# Altium footprint library con-samtec.PCBLIB: 805 footprints (part 43 of 55)
Each footprint in its own frame and in the unit in brackets; x right, y up, seen from the top. Pads: shape width x height; smd on the part's side, far side on the other; paste and mask are expansions set on the pad; w line width, h text height; cw(c..) or ccw(c..) is an arc to the next point about the centre after c.
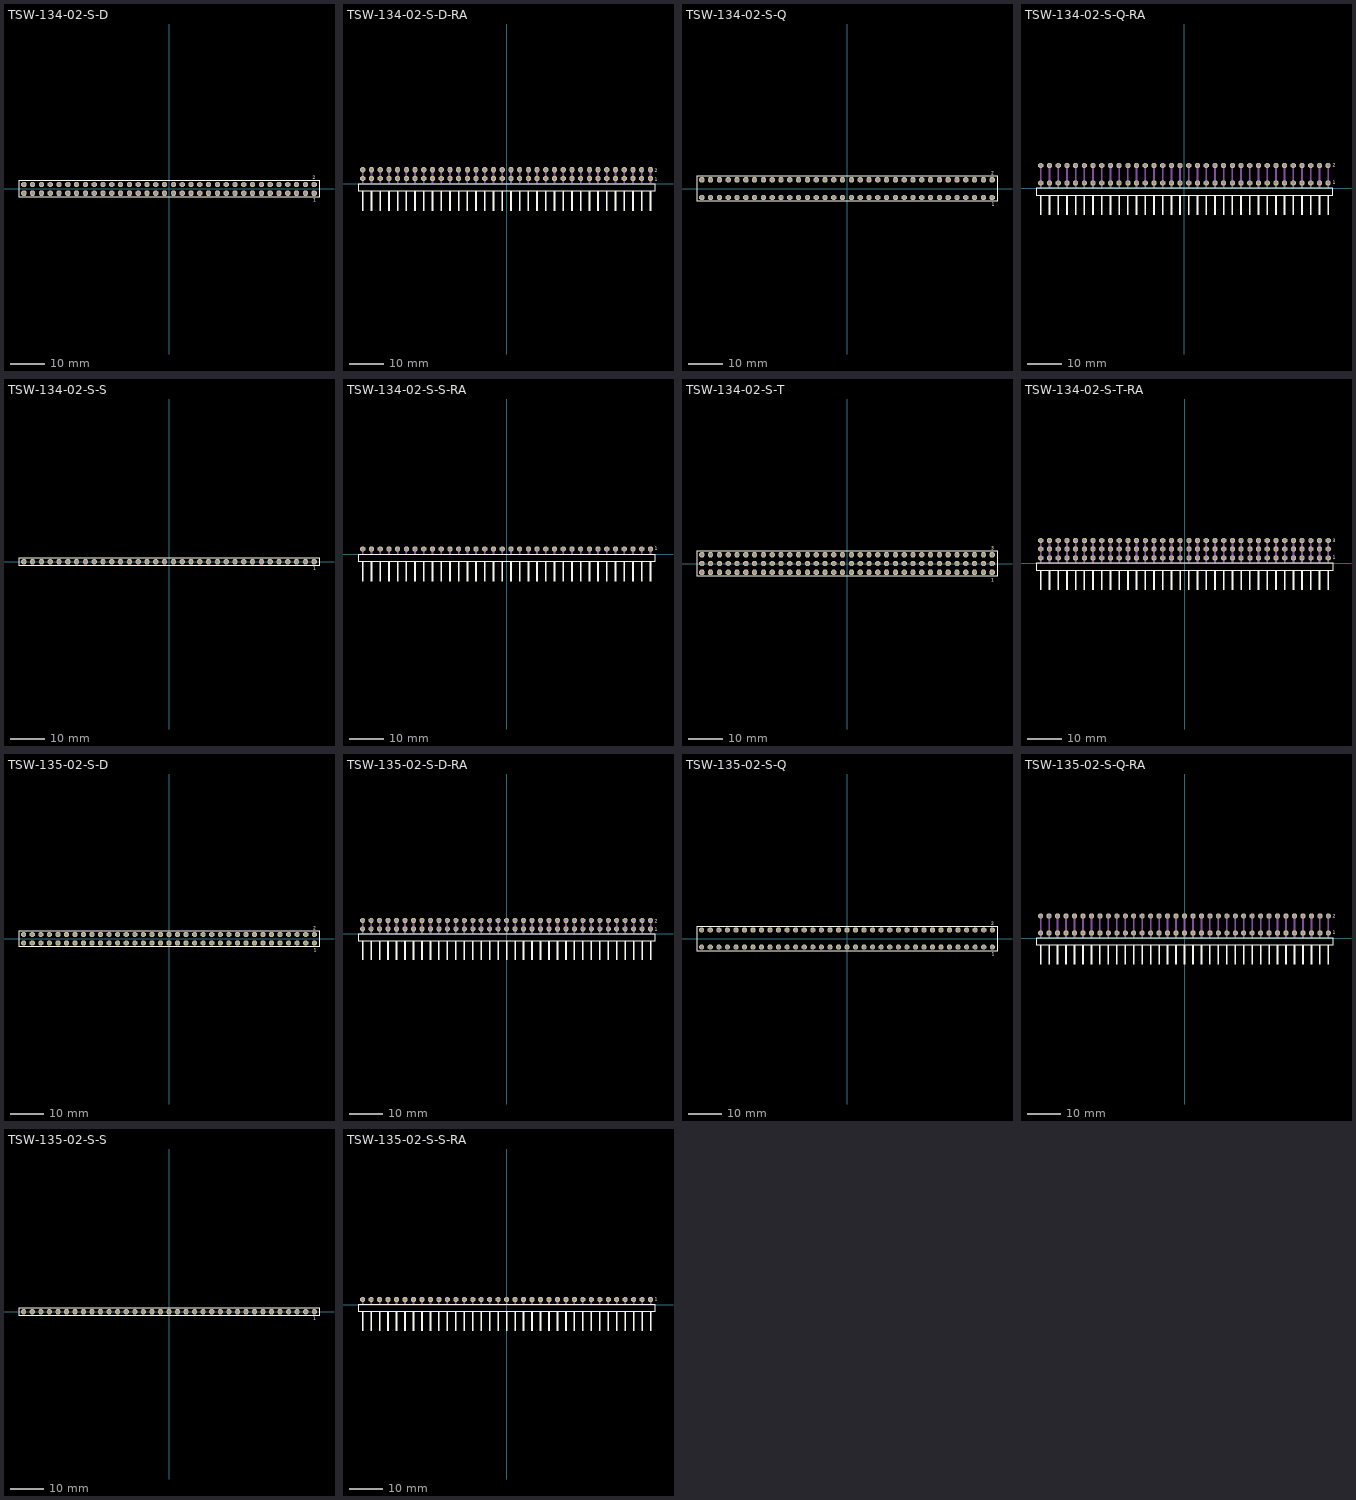
[diagram p42: the footprints below, top view; thin cyan lines are the x and y axes]

## TSW-134-02-S-D [mm]
pads (68):
  oct 1.5x1.5 hole 1: 1(41.91,-1.27) 2(41.91,1.27) 3(39.37,-1.27) 4(39.37,1.27) 5(36.83,-1.27) 6(36.83,1.27) 7(34.29,-1.27) 8(34.29,1.27) 9(31.75,-1.27) 10(31.75,1.27) 11(29.21,-1.27) 12(29.21,1.27) 13(26.67,-1.27) 14(26.67,1.27) 15(24.13,-1.27) 16(24.13,1.27) 17(21.59,-1.27) 18(21.59,1.27) 19(19.05,-1.27) 20(19.05,1.27) 21(16.51,-1.27) 22(16.51,1.27) 23(13.97,-1.27) 24(13.97,1.27) 25(11.43,-1.27) 26(11.43,1.27) 27(8.89,-1.27) 28(8.89,1.27) 29(6.35,-1.27) 30(6.35,1.27) 31(3.81,-1.27) 32(3.81,1.27) 33(1.27,-1.27) 34(1.27,1.27) 35(-1.27,-1.27) 36(-1.27,1.27) 37(-3.81,-1.27) 38(-3.81,1.27) 39(-6.35,-1.27) 40(-6.35,1.27) 41(-8.89,-1.27) 42(-8.89,1.27) 43(-11.43,-1.27) 44(-11.43,1.27) 45(-13.97,-1.27) 46(-13.97,1.27) 47(-16.51,-1.27) 48(-16.51,1.27) 49(-19.05,-1.27) 50(-19.05,1.27) 51(-21.59,-1.27) 52(-21.59,1.27) 53(-24.13,-1.27) 54(-24.13,1.27) 55(-26.67,-1.27) 56(-26.67,1.27) 57(-29.21,-1.27) 58(-29.21,1.27) 59(-31.75,-1.27) 60(-31.75,1.27) 61(-34.29,-1.27) 62(-34.29,1.27) 63(-36.83,-1.27) 64(-36.83,1.27) 65(-39.37,-1.27) 66(-39.37,1.27) 67(-41.91,-1.27) 68(-41.91,1.27)
Top Overlay:
  lines w0.203: -43.309,-2.425 43.309,-2.425 43.309,2.425 -43.309,2.425 -43.309,-2.425
  text "1" at 41.702,-3.818 h0.94
  text "2" at 41.527,2.744 h0.94
Mechanical 16:
  rectangle: -42.26,-1.62 -41.56,-0.92
  rectangle: -42.26,0.92 -41.56,1.62
  rectangle: -39.72,-1.62 -39.02,-0.92
  rectangle: -39.72,0.92 -39.02,1.62
  rectangle: -37.18,-1.62 -36.48,-0.92
  rectangle: -37.18,0.92 -36.48,1.62
  rectangle: -34.64,-1.62 -33.94,-0.92
  rectangle: -34.64,0.92 -33.94,1.62
  rectangle: -32.1,-1.62 -31.4,-0.92
  rectangle: -32.1,0.92 -31.4,1.62
  rectangle: -29.56,-1.62 -28.86,-0.92
  rectangle: -29.56,0.92 -28.86,1.62
  rectangle: -27.02,-1.62 -26.32,-0.92
  rectangle: -27.02,0.92 -26.32,1.62
  rectangle: -24.48,-1.62 -23.78,-0.92
  rectangle: -24.48,0.92 -23.78,1.62
  rectangle: -21.94,-1.62 -21.24,-0.92
  rectangle: -21.94,0.92 -21.24,1.62
  rectangle: -19.4,-1.62 -18.7,-0.92
  rectangle: -19.4,0.92 -18.7,1.62
  rectangle: -16.86,-1.62 -16.16,-0.92
  rectangle: -16.86,0.92 -16.16,1.62
  rectangle: -14.32,-1.62 -13.62,-0.92
  rectangle: -14.32,0.92 -13.62,1.62
  rectangle: -11.78,-1.62 -11.08,-0.92
  rectangle: -11.78,0.92 -11.08,1.62
  rectangle: -9.24,-1.62 -8.54,-0.92
  rectangle: -9.24,0.92 -8.54,1.62
  rectangle: -6.7,-1.62 -6,-0.92
  rectangle: -6.7,0.92 -6,1.62
  rectangle: -4.16,-1.62 -3.46,-0.92
  rectangle: -4.16,0.92 -3.46,1.62
  rectangle: -1.62,-1.62 -0.92,-0.92
  rectangle: -1.62,0.92 -0.92,1.62
  rectangle: 0.92,-1.62 1.62,-0.92
  rectangle: 0.92,0.92 1.62,1.62
  rectangle: 3.46,-1.62 4.16,-0.92
  rectangle: 3.46,0.92 4.16,1.62
  rectangle: 6,-1.62 6.7,-0.92
  rectangle: 6,0.92 6.7,1.62
  rectangle: 8.54,-1.62 9.24,-0.92
  rectangle: 8.54,0.92 9.24,1.62
  rectangle: 11.08,-1.62 11.78,-0.92
  rectangle: 11.08,0.92 11.78,1.62
  rectangle: 13.62,-1.62 14.32,-0.92
  rectangle: 13.62,0.92 14.32,1.62
  rectangle: 16.16,-1.62 16.86,-0.92
  rectangle: 16.16,0.92 16.86,1.62
  rectangle: 18.7,-1.62 19.4,-0.92
  rectangle: 18.7,0.92 19.4,1.62
  rectangle: 21.24,-1.62 21.94,-0.92
  rectangle: 21.24,0.92 21.94,1.62
  rectangle: 23.78,-1.62 24.48,-0.92
  rectangle: 23.78,0.92 24.48,1.62
  rectangle: 26.32,-1.62 27.02,-0.92
  rectangle: 26.32,0.92 27.02,1.62
  rectangle: 28.86,-1.62 29.56,-0.92
  rectangle: 28.86,0.92 29.56,1.62
  rectangle: 31.4,-1.62 32.1,-0.92
  rectangle: 31.4,0.92 32.1,1.62
  rectangle: 33.94,-1.62 34.64,-0.92
  rectangle: 33.94,0.92 34.64,1.62
  rectangle: 36.48,-1.62 37.18,-0.92
  rectangle: 36.48,0.92 37.18,1.62
  rectangle: 39.02,-1.62 39.72,-0.92
  rectangle: 39.02,0.92 39.72,1.62
  rectangle: 41.56,-1.62 42.26,-0.92
  rectangle: 41.56,0.92 42.26,1.62

## TSW-134-02-S-D-RA [mil]
pads (68):
  oct 59.06x59.06 hole 39.37: 1(1650,60) 2(1650,160) 3(1550,60) 4(1550,160) 5(1450,60) 6(1450,160) 7(1350,60) 8(1350,160) 9(1250,60) 10(1250,160) 11(1150,60) 12(1150,160) 13(1050,60) 14(1050,160) 15(950,60) 16(950,160) 17(850,60) 18(850,160) 19(750,60) 20(750,160) 21(650,60) 22(650,160) 23(550,60) 24(550,160) 25(450,60) 26(450,160) 27(350,60) 28(350,160) 29(250,60) 30(250,160) 31(150,60) 32(150,160) 33(50,60) 34(50,160) 35(-50,60) 36(-50,160) 37(-150,60) 38(-150,160) 39(-250,60) 40(-250,160) 41(-350,60) 42(-350,160) 43(-450,60) 44(-450,160) 45(-550,60) 46(-550,160) 47(-650,60) 48(-650,160) 49(-750,60) 50(-750,160) 51(-850,60) 52(-850,160) 53(-950,60) 54(-950,160) 55(-1050,60) 56(-1050,160) 57(-1150,60) 58(-1150,160) 59(-1250,60) 60(-1250,160) 61(-1350,60) 62(-1350,160) 63(-1450,60) 64(-1450,160) 65(-1550,60) 66(-1550,160) 67(-1650,60) 68(-1650,160)
Top Overlay:
  rectangle: -1660,-310.63 -1640,-80.32
  rectangle: -1560,-310.63 -1540,-80.32
  rectangle: -1460,-310.63 -1440,-80.32
  rectangle: -1360,-310.63 -1340,-80.32
  rectangle: -1260,-310.63 -1240,-80.32
  rectangle: -1160,-310.63 -1140,-80.32
  rectangle: -1060,-310.63 -1040,-80.32
  rectangle: -960,-310.63 -940,-80.32
  rectangle: -860,-310.63 -840,-80.32
  rectangle: -760,-310.63 -740,-80.32
  rectangle: -660,-310.63 -640,-80.32
  rectangle: -560,-310.63 -540,-80.32
  rectangle: -460,-310.63 -440,-80.32
  rectangle: -360,-310.63 -340,-80.32
  rectangle: -260,-310.63 -240,-80.32
  rectangle: -160,-310.63 -140,-80.32
  rectangle: -60,-310.63 -40,-80.32
  rectangle: 40,-310.63 60,-80.32
  rectangle: 140,-310.63 160,-80.32
  rectangle: 240,-310.63 260,-80.32
  rectangle: 340,-310.63 360,-80.32
  rectangle: 440,-310.63 460,-80.32
  rectangle: 540,-310.63 560,-80.32
  rectangle: 640,-310.63 660,-80.32
  rectangle: 740,-310.63 760,-80.32
  rectangle: 840,-310.63 860,-80.32
  rectangle: 940,-310.63 960,-80.32
  rectangle: 1040,-310.63 1060,-80.32
  rectangle: 1140,-310.63 1160,-80.32
  rectangle: 1240,-310.63 1260,-80.32
  rectangle: 1340,-310.63 1360,-80.32
  rectangle: 1440,-310.63 1460,-80.32
  rectangle: 1540,-310.63 1560,-80.32
  rectangle: 1640,-310.63 1660,-80.32
  lines w8: -1705.08,-80.55 1705.08,-80.55 1705.08,-4.17 -1705.08,-4.17 -1705.08,-80.55
  text "1" at 1700.59,30.51 h36.81
  text "2" at 1699.21,129.53 h36.81
Mechanical 16:
  rectangle: -1660,0 -1640,170
  rectangle: -1560,0 -1540,170
  rectangle: -1460,0 -1440,170
  rectangle: -1360,0 -1340,170
  rectangle: -1260,0 -1240,170
  rectangle: -1160,0 -1140,170
  rectangle: -1060,0 -1040,170
  rectangle: -960,0 -940,170
  rectangle: -860,0 -840,170
  rectangle: -760,0 -740,170
  rectangle: -660,0 -640,170
  rectangle: -560,0 -540,170
  rectangle: -460,0 -440,170
  rectangle: -360,0 -340,170
  rectangle: -260,0 -240,170
  rectangle: -160,0 -140,170
  rectangle: -60,0 -40,170
  rectangle: 40,0 60,170
  rectangle: 140,0 160,170
  rectangle: 240,0 260,170
  rectangle: 340,0 360,170
  rectangle: 440,0 460,170
  rectangle: 540,0 560,170
  rectangle: 640,0 660,170
  rectangle: 740,0 760,170
  rectangle: 840,0 860,170
  rectangle: 940,0 960,170
  rectangle: 1040,0 1060,170
  rectangle: 1140,0 1160,170
  rectangle: 1240,0 1260,170
  rectangle: 1340,0 1360,170
  rectangle: 1440,0 1460,170
  rectangle: 1540,0 1560,170
  rectangle: 1640,0 1660,170

## TSW-134-02-S-Q [mm]
pads (68):
  oct 1.5x1.5 hole 1: 1(41.91,-2.54) 2(41.91,2.54) 3(39.37,-2.54) 4(39.37,2.54) 5(36.83,-2.54) 6(36.83,2.54) 7(34.29,-2.54) 8(34.29,2.54) 9(31.75,-2.54) 10(31.75,2.54) 11(29.21,-2.54) 12(29.21,2.54) 13(26.67,-2.54) 14(26.67,2.54) 15(24.13,-2.54) 16(24.13,2.54) 17(21.59,-2.54) 18(21.59,2.54) 19(19.05,-2.54) 20(19.05,2.54) 21(16.51,-2.54) 22(16.51,2.54) 23(13.97,-2.54) 24(13.97,2.54) 25(11.43,-2.54) 26(11.43,2.54) 27(8.89,-2.54) 28(8.89,2.54) 29(6.35,-2.54) 30(6.35,2.54) 31(3.81,-2.54) 32(3.81,2.54) 33(1.27,-2.54) 34(1.27,2.54) 35(-1.27,-2.54) 36(-1.27,2.54) 37(-3.81,-2.54) 38(-3.81,2.54) 39(-6.35,-2.54) 40(-6.35,2.54) 41(-8.89,-2.54) 42(-8.89,2.54) 43(-11.43,-2.54) 44(-11.43,2.54) 45(-13.97,-2.54) 46(-13.97,2.54) 47(-16.51,-2.54) 48(-16.51,2.54) 49(-19.05,-2.54) 50(-19.05,2.54) 51(-21.59,-2.54) 52(-21.59,2.54) 53(-24.13,-2.54) 54(-24.13,2.54) 55(-26.67,-2.54) 56(-26.67,2.54) 57(-29.21,-2.54) 58(-29.21,2.54) 59(-31.75,-2.54) 60(-31.75,2.54) 61(-34.29,-2.54) 62(-34.29,2.54) 63(-36.83,-2.54) 64(-36.83,2.54) 65(-39.37,-2.54) 66(-39.37,2.54) 67(-41.91,-2.54) 68(-41.91,2.54)
Top Overlay:
  lines w0.203: -43.309,-3.695 43.309,-3.695 43.309,3.695 -43.309,3.695 -43.309,-3.695
  text "1" at 41.752,-5.138 h0.94
  text "2" at 41.652,3.989 h0.94
Mechanical 16:
  rectangle: -42.26,-2.89 -41.56,-2.19
  rectangle: -42.26,2.19 -41.56,2.89
  rectangle: -39.72,-2.89 -39.02,-2.19
  rectangle: -39.72,2.19 -39.02,2.89
  rectangle: -37.18,-2.89 -36.48,-2.19
  rectangle: -37.18,2.19 -36.48,2.89
  rectangle: -34.64,-2.89 -33.94,-2.19
  rectangle: -34.64,2.19 -33.94,2.89
  rectangle: -32.1,-2.89 -31.4,-2.19
  rectangle: -32.1,2.19 -31.4,2.89
  rectangle: -29.56,-2.89 -28.86,-2.19
  rectangle: -29.56,2.19 -28.86,2.89
  rectangle: -27.02,-2.89 -26.32,-2.19
  rectangle: -27.02,2.19 -26.32,2.89
  rectangle: -24.48,-2.89 -23.78,-2.19
  rectangle: -24.48,2.19 -23.78,2.89
  rectangle: -21.94,-2.89 -21.24,-2.19
  rectangle: -21.94,2.19 -21.24,2.89
  rectangle: -19.4,-2.89 -18.7,-2.19
  rectangle: -19.4,2.19 -18.7,2.89
  rectangle: -16.86,-2.89 -16.16,-2.19
  rectangle: -16.86,2.19 -16.16,2.89
  rectangle: -14.32,-2.89 -13.62,-2.19
  rectangle: -14.32,2.19 -13.62,2.89
  rectangle: -11.78,-2.89 -11.08,-2.19
  rectangle: -11.78,2.19 -11.08,2.89
  rectangle: -9.24,-2.89 -8.54,-2.19
  rectangle: -9.24,2.19 -8.54,2.89
  rectangle: -6.7,-2.89 -6,-2.19
  rectangle: -6.7,2.19 -6,2.89
  rectangle: -4.16,-2.89 -3.46,-2.19
  rectangle: -4.16,2.19 -3.46,2.89
  rectangle: -1.62,-2.89 -0.92,-2.19
  rectangle: -1.62,2.19 -0.92,2.89
  rectangle: 0.92,-2.89 1.62,-2.19
  rectangle: 0.92,2.19 1.62,2.89
  rectangle: 3.46,-2.89 4.16,-2.19
  rectangle: 3.46,2.19 4.16,2.89
  rectangle: 6,-2.89 6.7,-2.19
  rectangle: 6,2.19 6.7,2.89
  rectangle: 8.54,-2.89 9.24,-2.19
  rectangle: 8.54,2.19 9.24,2.89
  rectangle: 11.08,-2.89 11.78,-2.19
  rectangle: 11.08,2.19 11.78,2.89
  rectangle: 13.62,-2.89 14.32,-2.19
  rectangle: 13.62,2.19 14.32,2.89
  rectangle: 16.16,-2.89 16.86,-2.19
  rectangle: 16.16,2.19 16.86,2.89
  rectangle: 18.7,-2.89 19.4,-2.19
  rectangle: 18.7,2.19 19.4,2.89
  rectangle: 21.24,-2.89 21.94,-2.19
  rectangle: 21.24,2.19 21.94,2.89
  rectangle: 23.78,-2.89 24.48,-2.19
  rectangle: 23.78,2.19 24.48,2.89
  rectangle: 26.32,-2.89 27.02,-2.19
  rectangle: 26.32,2.19 27.02,2.89
  rectangle: 28.86,-2.89 29.56,-2.19
  rectangle: 28.86,2.19 29.56,2.89
  rectangle: 31.4,-2.89 32.1,-2.19
  rectangle: 31.4,2.19 32.1,2.89
  rectangle: 33.94,-2.89 34.64,-2.19
  rectangle: 33.94,2.19 34.64,2.89
  rectangle: 36.48,-2.89 37.18,-2.19
  rectangle: 36.48,2.19 37.18,2.89
  rectangle: 39.02,-2.89 39.72,-2.19
  rectangle: 39.02,2.19 39.72,2.89
  rectangle: 41.56,-2.89 42.26,-2.19
  rectangle: 41.56,2.19 42.26,2.89

## TSW-134-02-S-Q-RA [mil]
pads (68):
  oct 59.06x59.06 hole 39.37: 1(1650,60) 2(1650,260) 3(1550,60) 4(1550,260) 5(1450,60) 6(1450,260) 7(1350,60) 8(1350,260) 9(1250,60) 10(1250,260) 11(1150,60) 12(1150,260) 13(1050,60) 14(1050,260) 15(950,60) 16(950,260) 17(850,60) 18(850,260) 19(750,60) 20(750,260) 21(650,60) 22(650,260) 23(550,60) 24(550,260) 25(450,60) 26(450,260) 27(350,60) 28(350,260) 29(250,60) 30(250,260) 31(150,60) 32(150,260) 33(50,60) 34(50,260) 35(-50,60) 36(-50,260) 37(-150,60) 38(-150,260) 39(-250,60) 40(-250,260) 41(-350,60) 42(-350,260) 43(-450,60) 44(-450,260) 45(-550,60) 46(-550,260) 47(-650,60) 48(-650,260) 49(-750,60) 50(-750,260) 51(-850,60) 52(-850,260) 53(-950,60) 54(-950,260) 55(-1050,60) 56(-1050,260) 57(-1150,60) 58(-1150,260) 59(-1250,60) 60(-1250,260) 61(-1350,60) 62(-1350,260) 63(-1450,60) 64(-1450,260) 65(-1550,60) 66(-1550,260) 67(-1650,60) 68(-1650,260)
Top Overlay:
  rectangle: -1660,-310.63 -1640,-80.32
  rectangle: -1560,-310.63 -1540,-80.32
  rectangle: -1460,-310.63 -1440,-80.32
  rectangle: -1360,-310.63 -1340,-80.32
  rectangle: -1260,-310.63 -1240,-80.32
  rectangle: -1160,-310.63 -1140,-80.32
  rectangle: -1060,-310.63 -1040,-80.32
  rectangle: -960,-310.63 -940,-80.32
  rectangle: -860,-310.63 -840,-80.32
  rectangle: -760,-310.63 -740,-80.32
  rectangle: -660,-310.63 -640,-80.32
  rectangle: -560,-310.63 -540,-80.32
  rectangle: -460,-310.63 -440,-80.32
  rectangle: -360,-310.63 -340,-80.32
  rectangle: -260,-310.63 -240,-80.32
  rectangle: -160,-310.63 -140,-80.32
  rectangle: -60,-310.63 -40,-80.32
  rectangle: 40,-310.63 60,-80.32
  rectangle: 140,-310.63 160,-80.32
  rectangle: 240,-310.63 260,-80.32
  rectangle: 340,-310.63 360,-80.32
  rectangle: 440,-310.63 460,-80.32
  rectangle: 540,-310.63 560,-80.32
  rectangle: 640,-310.63 660,-80.32
  rectangle: 740,-310.63 760,-80.32
  rectangle: 840,-310.63 860,-80.32
  rectangle: 940,-310.63 960,-80.32
  rectangle: 1040,-310.63 1060,-80.32
  rectangle: 1140,-310.63 1160,-80.32
  rectangle: 1240,-310.63 1260,-80.32
  rectangle: 1340,-310.63 1360,-80.32
  rectangle: 1440,-310.63 1460,-80.32
  rectangle: 1540,-310.63 1560,-80.32
  rectangle: 1640,-310.63 1660,-80.32
  lines w8: -1705.08,-80.55 1705.08,-80.55 1705.08,-4.17 -1705.08,-4.17 -1705.08,-80.55
  text "1" at 1703.54,43.31 h36.81
  text "2" at 1701.18,242.72 h36.81
Mechanical 16:
  rectangle: -1660,0 -1640,270
  rectangle: -1560,0 -1540,270
  rectangle: -1460,0 -1440,270
  rectangle: -1360,0 -1340,270
  rectangle: -1260,0 -1240,270
  rectangle: -1160,0 -1140,270
  rectangle: -1060,0 -1040,270
  rectangle: -960,0 -940,270
  rectangle: -860,0 -840,270
  rectangle: -760,0 -740,270
  rectangle: -660,0 -640,270
  rectangle: -560,0 -540,270
  rectangle: -460,0 -440,270
  rectangle: -360,0 -340,270
  rectangle: -260,0 -240,270
  rectangle: -160,0 -140,270
  rectangle: -60,0 -40,270
  rectangle: 40,0 60,270
  rectangle: 140,0 160,270
  rectangle: 240,0 260,270
  rectangle: 340,0 360,270
  rectangle: 440,0 460,270
  rectangle: 540,0 560,270
  rectangle: 640,0 660,270
  rectangle: 740,0 760,270
  rectangle: 840,0 860,270
  rectangle: 940,0 960,270
  rectangle: 1040,0 1060,270
  rectangle: 1140,0 1160,270
  rectangle: 1240,0 1260,270
  rectangle: 1340,0 1360,270
  rectangle: 1440,0 1460,270
  rectangle: 1540,0 1560,270
  rectangle: 1640,0 1660,270

## TSW-134-02-S-S [mm]
pads (34):
  oct 1.5x1.5 hole 1: 1(41.91,0) 2(39.37,0) 3(36.83,0) 4(34.29,0) 5(31.75,0) 6(29.21,0) 7(26.67,0) 8(24.13,0) 9(21.59,0) 10(19.05,0) 11(16.51,0) 12(13.97,0) 13(11.43,0) 14(8.89,0) 15(6.35,0) 16(3.81,0) 17(1.27,0) 18(-1.27,0) 19(-3.81,0) 20(-6.35,0) 21(-8.89,0) 22(-11.43,0) 23(-13.97,0) 24(-16.51,0) 25(-19.05,0) 26(-21.59,0) 27(-24.13,0) 28(-26.67,0) 29(-29.21,0) 30(-31.75,0) 31(-34.29,0) 32(-36.83,0) 33(-39.37,0) 34(-41.91,0)
Top Overlay:
  lines w0.203: -43.309,-1.155 43.309,-1.155 43.309,1.155 -43.309,1.155 -43.309,-1.155
  text "1" at 41.652,-2.498 h0.94
Mechanical 16:
  rectangle: -42.26,-0.35 -41.56,0.35
  rectangle: -39.72,-0.35 -39.02,0.35
  rectangle: -37.18,-0.35 -36.48,0.35
  rectangle: -34.64,-0.35 -33.94,0.35
  rectangle: -32.1,-0.35 -31.4,0.35
  rectangle: -29.56,-0.35 -28.86,0.35
  rectangle: -27.02,-0.35 -26.32,0.35
  rectangle: -24.48,-0.35 -23.78,0.35
  rectangle: -21.94,-0.35 -21.24,0.35
  rectangle: -19.4,-0.35 -18.7,0.35
  rectangle: -16.86,-0.35 -16.16,0.35
  rectangle: -14.32,-0.35 -13.62,0.35
  rectangle: -11.78,-0.35 -11.08,0.35
  rectangle: -9.24,-0.35 -8.54,0.35
  rectangle: -6.7,-0.35 -6,0.35
  rectangle: -4.16,-0.35 -3.46,0.35
  rectangle: -1.62,-0.35 -0.92,0.35
  rectangle: 0.92,-0.35 1.62,0.35
  rectangle: 3.46,-0.35 4.16,0.35
  rectangle: 6,-0.35 6.7,0.35
  rectangle: 8.54,-0.35 9.24,0.35
  rectangle: 11.08,-0.35 11.78,0.35
  rectangle: 13.62,-0.35 14.32,0.35
  rectangle: 16.16,-0.35 16.86,0.35
  rectangle: 18.7,-0.35 19.4,0.35
  rectangle: 21.24,-0.35 21.94,0.35
  rectangle: 23.78,-0.35 24.48,0.35
  rectangle: 26.32,-0.35 27.02,0.35
  rectangle: 28.86,-0.35 29.56,0.35
  rectangle: 31.4,-0.35 32.1,0.35
  rectangle: 33.94,-0.35 34.64,0.35
  rectangle: 36.48,-0.35 37.18,0.35
  rectangle: 39.02,-0.35 39.72,0.35
  rectangle: 41.56,-0.35 42.26,0.35

## TSW-134-02-S-S-RA [mil]
pads (34):
  oct 59.06x59.06 hole 39.37: 1(1650,60) 2(1550,60) 3(1450,60) 4(1350,60) 5(1250,60) 6(1150,60) 7(1050,60) 8(950,60) 9(850,60) 10(750,60) 11(650,60) 12(550,60) 13(450,60) 14(350,60) 15(250,60) 16(150,60) 17(50,60) 18(-50,60) 19(-150,60) 20(-250,60) 21(-350,60) 22(-450,60) 23(-550,60) 24(-650,60) 25(-750,60) 26(-850,60) 27(-950,60) 28(-1050,60) 29(-1150,60) 30(-1250,60) 31(-1350,60) 32(-1450,60) 33(-1550,60) 34(-1650,60)
Top Overlay:
  rectangle: -1660,-310.63 -1640,-80.32
  rectangle: -1560,-310.63 -1540,-80.32
  rectangle: -1460,-310.63 -1440,-80.32
  rectangle: -1360,-310.63 -1340,-80.32
  rectangle: -1260,-310.63 -1240,-80.32
  rectangle: -1160,-310.63 -1140,-80.32
  rectangle: -1060,-310.63 -1040,-80.32
  rectangle: -960,-310.63 -940,-80.32
  rectangle: -860,-310.63 -840,-80.32
  rectangle: -760,-310.63 -740,-80.32
  rectangle: -660,-310.63 -640,-80.32
  rectangle: -560,-310.63 -540,-80.32
  rectangle: -460,-310.63 -440,-80.32
  rectangle: -360,-310.63 -340,-80.32
  rectangle: -260,-310.63 -240,-80.32
  rectangle: -160,-310.63 -140,-80.32
  rectangle: -60,-310.63 -40,-80.32
  rectangle: 40,-310.63 60,-80.32
  rectangle: 140,-310.63 160,-80.32
  rectangle: 240,-310.63 260,-80.32
  rectangle: 340,-310.63 360,-80.32
  rectangle: 440,-310.63 460,-80.32
  rectangle: 540,-310.63 560,-80.32
  rectangle: 640,-310.63 660,-80.32
  rectangle: 740,-310.63 760,-80.32
  rectangle: 840,-310.63 860,-80.32
  rectangle: 940,-310.63 960,-80.32
  rectangle: 1040,-310.63 1060,-80.32
  rectangle: 1140,-310.63 1160,-80.32
  rectangle: 1240,-310.63 1260,-80.32
  rectangle: 1340,-310.63 1360,-80.32
  rectangle: 1440,-310.63 1460,-80.32
  rectangle: 1540,-310.63 1560,-80.32
  rectangle: 1640,-310.63 1660,-80.32
  lines w8: -1705.08,-80.55 1705.08,-80.55 1705.08,-4.17 -1705.08,-4.17 -1705.08,-80.55
  text "1" at 1700.47,45.35 h36.81
Mechanical 16:
  rectangle: -1660,0 -1640,70
  rectangle: -1560,0 -1540,70
  rectangle: -1460,0 -1440,70
  rectangle: -1360,0 -1340,70
  rectangle: -1260,0 -1240,70
  rectangle: -1160,0 -1140,70
  rectangle: -1060,0 -1040,70
  rectangle: -960,0 -940,70
  rectangle: -860,0 -840,70
  rectangle: -760,0 -740,70
  rectangle: -660,0 -640,70
  rectangle: -560,0 -540,70
  rectangle: -460,0 -440,70
  rectangle: -360,0 -340,70
  rectangle: -260,0 -240,70
  rectangle: -160,0 -140,70
  rectangle: -60,0 -40,70
  rectangle: 40,0 60,70
  rectangle: 140,0 160,70
  rectangle: 240,0 260,70
  rectangle: 340,0 360,70
  rectangle: 440,0 460,70
  rectangle: 540,0 560,70
  rectangle: 640,0 660,70
  rectangle: 740,0 760,70
  rectangle: 840,0 860,70
  rectangle: 940,0 960,70
  rectangle: 1040,0 1060,70
  rectangle: 1140,0 1160,70
  rectangle: 1240,0 1260,70
  rectangle: 1340,0 1360,70
  rectangle: 1440,0 1460,70
  rectangle: 1540,0 1560,70
  rectangle: 1640,0 1660,70

## TSW-134-02-S-T [mm]
pads (102):
  oct 1.5x1.5 hole 1: 1(41.91,-2.54) 2(41.91,0) 3(41.91,2.54) 4(39.37,-2.54) 5(39.37,0) 6(39.37,2.54) 7(36.83,-2.54) 8(36.83,0) 9(36.83,2.54) 10(34.29,-2.54) 11(34.29,0) 12(34.29,2.54) 13(31.75,-2.54) 14(31.75,0) 15(31.75,2.54) 16(29.21,-2.54) 17(29.21,0) 18(29.21,2.54) 19(26.67,-2.54) 20(26.67,0) 21(26.67,2.54) 22(24.13,-2.54) 23(24.13,0) 24(24.13,2.54) 25(21.59,-2.54) 26(21.59,0) 27(21.59,2.54) 28(19.05,-2.54) 29(19.05,0) 30(19.05,2.54) 31(16.51,-2.54) 32(16.51,0) 33(16.51,2.54) 34(13.97,-2.54) 35(13.97,0) 36(13.97,2.54) 37(11.43,-2.54) 38(11.43,0) 39(11.43,2.54) 40(8.89,-2.54) 41(8.89,0) 42(8.89,2.54) 43(6.35,-2.54) 44(6.35,0) 45(6.35,2.54) 46(3.81,-2.54) 47(3.81,0) 48(3.81,2.54) 49(1.27,-2.54) 50(1.27,0) 51(1.27,2.54) 52(-1.27,-2.54) 53(-1.27,0) 54(-1.27,2.54) 55(-3.81,-2.54) 56(-3.81,0) 57(-3.81,2.54) 58(-6.35,-2.54) 59(-6.35,0) 60(-6.35,2.54) 61(-8.89,-2.54) 62(-8.89,0) 63(-8.89,2.54) 64(-11.43,-2.54) 65(-11.43,0) 66(-11.43,2.54) 67(-13.97,-2.54) 68(-13.97,0) 69(-13.97,2.54) 70(-16.51,-2.54) 71(-16.51,0) 72(-16.51,2.54) 73(-19.05,-2.54) 74(-19.05,0) 75(-19.05,2.54) 76(-21.59,-2.54) 77(-21.59,0) 78(-21.59,2.54) 79(-24.13,-2.54) 80(-24.13,0) 81(-24.13,2.54) 82(-26.67,-2.54) 83(-26.67,0) 84(-26.67,2.54) 85(-29.21,-2.54) 86(-29.21,0) 87(-29.21,2.54) 88(-31.75,-2.54) 89(-31.75,0) 90(-31.75,2.54) 91(-34.29,-2.54) 92(-34.29,0) 93(-34.29,2.54) 94(-36.83,-2.54) 95(-36.83,0) 96(-36.83,2.54) 97(-39.37,-2.54) 98(-39.37,0) 99(-39.37,2.54) 100(-41.91,-2.54) 101(-41.91,0) 102(-41.91,2.54)
Top Overlay:
  lines w0.203: -43.309,-3.695 43.309,-3.695 43.309,3.695 -43.309,3.695 -43.309,-3.695
  text "1" at 41.602,-5.188 h0.94
  text "3" at 41.598,3.989 h0.94
Mechanical 16:
  rectangle: -42.26,-2.89 -41.56,-2.19
  rectangle: -42.26,-0.35 -41.56,0.35
  rectangle: -42.26,2.19 -41.56,2.89
  rectangle: -39.72,-2.89 -39.02,-2.19
  rectangle: -39.72,-0.35 -39.02,0.35
  rectangle: -39.72,2.19 -39.02,2.89
  rectangle: -37.18,-2.89 -36.48,-2.19
  rectangle: -37.18,-0.35 -36.48,0.35
  rectangle: -37.18,2.19 -36.48,2.89
  rectangle: -34.64,-2.89 -33.94,-2.19
  rectangle: -34.64,-0.35 -33.94,0.35
  rectangle: -34.64,2.19 -33.94,2.89
  rectangle: -32.1,-2.89 -31.4,-2.19
  rectangle: -32.1,-0.35 -31.4,0.35
  rectangle: -32.1,2.19 -31.4,2.89
  rectangle: -29.56,-2.89 -28.86,-2.19
  rectangle: -29.56,-0.35 -28.86,0.35
  rectangle: -29.56,2.19 -28.86,2.89
  rectangle: -27.02,-2.89 -26.32,-2.19
  rectangle: -27.02,-0.35 -26.32,0.35
  rectangle: -27.02,2.19 -26.32,2.89
  rectangle: -24.48,-2.89 -23.78,-2.19
  rectangle: -24.48,-0.35 -23.78,0.35
  rectangle: -24.48,2.19 -23.78,2.89